# Altium footprint library Semi-ATE.PcbLib: 155 footprints (part 3 of 10)
Each footprint in its own frame and in the unit in brackets; x right, y up, seen from the top. Pads: shape width x height; smd on the part's side, far side on the other; paste and mask are expansions set on the pad; w line width, h text height; cw(c..) or ccw(c..) is an arc to the next point about the centre after c.
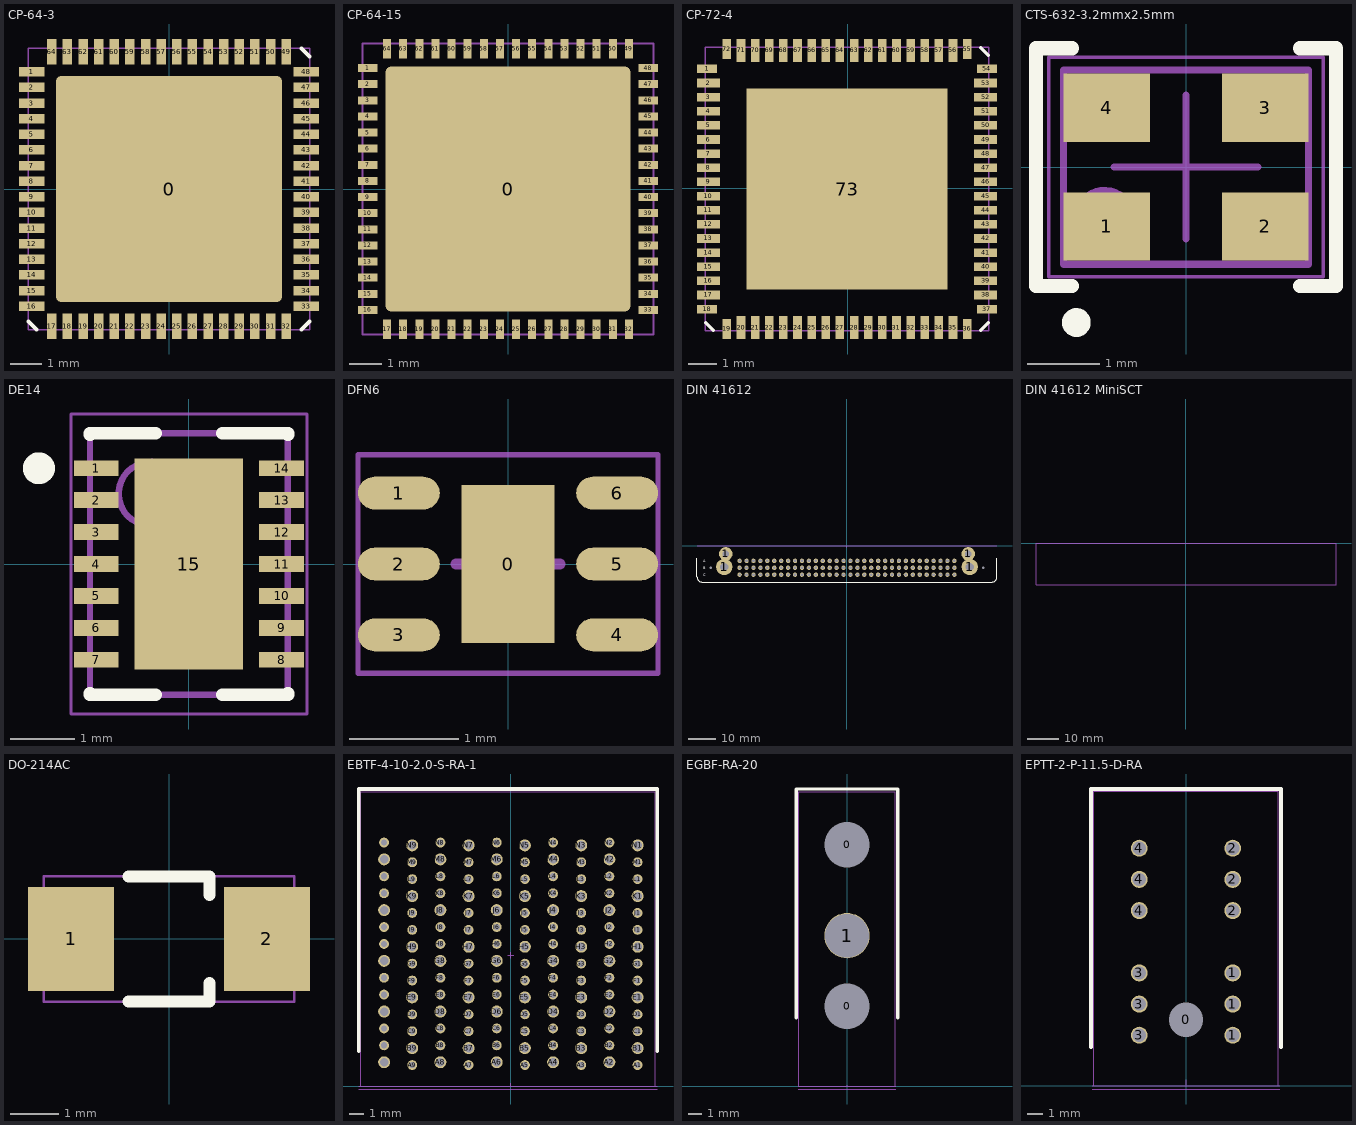
[diagram p2: the footprints below, top view; thin cyan lines are the x and y axes]

## CP-64-3 [mil] "64-Lead Lead Frame Chip Scale Package [LFCSP_VQ]"
pads (65):
  rrect5% 285x285 smd paste-314.96: 0(0,0)
  rect 32x12 smd mask+5: 1(-173,147.64) 2(-173,127.95) 3(-173,108.27) 4(-173,88.58) 5(-173,68.9) 6(-173,49.21) 7(-173,29.53) 8(-173,9.84) 9(-173,-9.84) 10(-173,-29.53) 11(-173,-49.21) 12(-173,-68.9) 13(-173,-88.58) 14(-173,-108.27) 15(-173,-127.95) 16(-173,-147.64) 33(173,-147.64) 34(173,-127.95) 35(173,-108.27) 36(173,-88.58) 37(173,-68.9) 38(173,-49.21) 39(173,-29.53) 40(173,-9.84) 41(173,9.84) 42(173,29.53) 43(173,49.21) 44(173,68.9) 45(173,88.58) 46(173,108.27) 47(173,127.95) 48(173,147.64)
  rect 12x32 smd mask+5: 17(-147.64,-173) 18(-127.95,-173) 19(-108.27,-173) 20(-88.58,-173) 21(-68.9,-173) 22(-49.21,-173) 23(-29.53,-173) 24(-9.84,-173) 25(9.84,-173) 26(29.53,-173) 27(49.21,-173) 28(68.9,-173) 29(88.58,-173) 30(108.27,-173) 31(127.95,-173) 32(147.64,-173) 49(147.64,173) 50(127.95,173) 51(108.27,173) 52(88.58,173) 53(68.9,173) 54(49.21,173) 55(29.53,173) 56(9.84,173) 57(-9.84,173) 58(-29.53,173) 59(-49.21,173) 60(-68.9,173) 61(-88.58,173) 62(-108.27,173) 63(-127.95,173) 64(-147.64,173)
Top Overlay:
  lines w5: -177,-166.74 -166.74,-177 ; 166.74,-177 177,-166.74 ; 166.74,177 177,166.74
  text "." at -181.1,173.23 h75
Top Paste:
  rectangle: 9.84,9.84 136.81,136.81
  rectangle: 9.84,-136.81 136.81,-9.84
  rectangle: -136.81,9.84 -9.84,136.81
  rectangle: -136.81,-136.81 -9.84,-9.84
Top Designator:
  text ".Designator" at -299.9,-19.99 h60
Top 3D Body:
  lines w1.97: -177.16,-177.16 177.17,-177.16 177.17,177.17 -177.16,177.17 -177.16,-177.16
3D body "CP-64-3.step": height 32.68, standoff -1.57, extent -177.16,-177.16 177.17,177.17

## CP-64-15 [mm] "64 Lead LFCSP"
height 2.5
pads (65):
  rrect5% 7.6x7.6 smd paste-8: 0(0,0)
  rect 0.6x0.25 smd: 1(-4.35,3.75) 2(-4.35,3.25) 3(-4.35,2.75) 4(-4.35,2.25) 5(-4.35,1.75) 6(-4.35,1.25) 7(-4.35,0.75) 8(-4.35,0.25) 9(-4.35,-0.25) 10(-4.35,-0.75) 11(-4.35,-1.25) 12(-4.35,-1.75) 13(-4.35,-2.25) 14(-4.35,-2.75) 15(-4.35,-3.25) 16(-4.35,-3.75) 33(4.35,-3.75) 34(4.35,-3.25) 35(4.35,-2.75) 36(4.35,-2.25) 37(4.35,-1.75) 38(4.35,-1.25) 39(4.35,-0.75) 40(4.35,-0.25) 41(4.35,0.25) 42(4.35,0.75) 43(4.35,1.25) 44(4.35,1.75) 45(4.35,2.25) 46(4.35,2.75) 47(4.35,3.25) 48(4.35,3.75)
  rect 0.25x0.6 smd: 17(-3.75,-4.35) 18(-3.25,-4.35) 19(-2.75,-4.35) 20(-2.25,-4.35) 21(-1.75,-4.35) 22(-1.25,-4.35) 23(-0.75,-4.35) 24(-0.25,-4.35) 25(0.25,-4.35) 26(0.75,-4.35) 27(1.25,-4.35) 28(1.75,-4.35) 29(2.25,-4.35) 30(2.75,-4.35) 31(3.25,-4.35) 32(3.75,-4.35) 49(3.75,4.35) 50(3.25,4.35) 51(2.75,4.35) 52(2.25,4.35) 53(1.75,4.35) 54(1.25,4.35) 55(0.75,4.35) 56(0.25,4.35) 57(-0.25,4.35) 58(-0.75,4.35) 59(-1.25,4.35) 60(-1.75,4.35) 61(-2.25,4.35) 62(-2.75,4.35) 63(-3.25,4.35) 64(-3.75,4.35)
Top Overlay:
  text "." at -4.514,4.673 h1
Top Paste:
  rectangle: -3.3,-3.3 -0.5,-0.5
  rectangle: 0.5,-3.3 3.3,-0.5
  rectangle: 0.5,0.5 3.3,3.3
  rectangle: -3.3,0.5 -0.5,3.3
Top Designator:
  text ".Designator" at -7.709,-0.42 h1.52
Top 3D Body:
  lines w0.05: -4.51,-4.51 -4.51,4.51 4.51,4.51 4.51,-4.51 -4.51,-4.51
3D body "CP-64-15.STEP": height 0.73, standoff -0.02, extent -4.51,-4.51 4.51,4.51

## CP-72-4 [mil] "72 Lead LFCSP_VQ (10x10mm)"
pads (73):
  rect 28.07x12 smd mask+5: 1(-195.97,166.32) 18(-195.97,-168.32) 37(193.97,-168.32) 54(193.97,166.32)
  rect 32x12 smd mask+5: 2(-194,146.64) 3(-194,126.95) 4(-194,107.27) 5(-194,87.58) 6(-194,67.9) 7(-194,48.21) 8(-194,28.53) 9(-194,8.84) 10(-194,-10.84) 11(-194,-30.53) 12(-194,-50.21) 13(-194,-69.9) 14(-194,-89.58) 15(-194,-109.27) 16(-194,-128.95) 17(-194,-148.64) 38(192,-148.64) 39(192,-128.95) 40(192,-109.27) 41(192,-89.58) 42(192,-69.9) 43(192,-50.21) 44(192,-30.53) 45(192,-10.84) 46(192,8.84) 47(192,28.53) 48(192,48.21) 49(192,67.9) 50(192,87.58) 51(192,107.27) 52(192,126.95) 53(192,146.64)
  rect 12x28.07 smd mask+5: 19(-168.32,-195.97) 36(166.32,-195.97) 55(166.32,193.97) 72(-168.32,193.97)
  rect 12x32 smd mask+5: 20(-148.64,-194) 21(-128.95,-194) 22(-109.27,-194) 23(-89.58,-194) 24(-69.9,-194) 25(-50.21,-194) 26(-30.53,-194) 27(-10.84,-194) 28(8.84,-194) 29(28.53,-194) 30(48.21,-194) 31(67.9,-194) 32(87.58,-194) 33(107.27,-194) 34(126.95,-194) 35(146.64,-194) 56(146.64,192) 57(126.95,192) 58(107.27,192) 59(87.58,192) 60(67.9,192) 61(48.21,192) 62(28.53,192) 63(8.84,192) 64(-10.84,192) 65(-30.53,192) 66(-50.21,192) 67(-69.9,192) 68(-89.58,192) 69(-109.27,192) 70(-128.95,192) 71(-148.64,192)
  rect 280x280 smd: 73(-1,-1)
Top Overlay:
  lines w5: -198,-187.42 -187.42,-198 ; 185.42,-198 196,-187.42 ; 185.42,196 196,185.42
  text "." at -200.79,192.91 h75
Top Designator:
  text ".Designator" at -300.9,-20.99 h60
Top 3D Body:
  lines w1.97: -198.62,-198.62 196.66,-198.62 196.66,196.66 -198.62,196.66 -198.62,-198.62
3D body "LFCSP72(CP-72-x).STEP": height 39.37, standoff 0, extent -198.62,-198.62 196.66,196.66

## CTS-632-3.2mmx2.5mm [mm]
height 1.2
pads (4):
  rect 1.2x0.95 smd: 1(-1.1,-0.825) 2(1.1,-0.825) 3(1.1,0.825) 4(-1.1,0.825)
Top Overlay:
  circle w0.2: c-1.524,-2.159 r0.1
  lines w0.2: -1.584,-1.651 -2.084,-1.651 -2.084,1.651 -1.584,1.651 ; 1.584,-1.651 2.084,-1.651 2.084,1.651 1.584,1.651
Top Designator:
  text ".Designator" at -7.618,-0.812 h1.52
Top 3D Body:
  lines w0.05: -1.905,-1.524 1.905,-1.524 1.905,1.524 -1.905,1.524 -1.905,-1.524
Bottom 3D Body:
  circle w0.1: c-1.132,-0.725 r0.4
  lines w0.1: -1.7,-1.35 1.7,-1.35 1.7,1.35 -1.7,1.35 -1.7,-1.346 ; -1.698,-1.348 -1.7,-1.346 ; -1.696,-1.35 -1.7,-1.346
Bottom Gold Plating:
  lines w0.1: -1,0 1,0 ; 0,-1 0,1
3D body: height 1.2, standoff 0, extent -1.7,-1.347 1.7,1.35

## DE14 [mm]
height 0.8
pads (15):
  rect 0.7x0.25 smd: 1(-1.45,1.5) 2(-1.45,1) 3(-1.45,0.5) 4(-1.45,0) 5(-1.45,-0.5) 6(-1.45,-1) 7(-1.45,-1.5) 8(1.45,-1.5) 9(1.45,-1) 10(1.45,-0.5) 11(1.45,0) 12(1.45,0.5) 13(1.45,1) 14(1.45,1.5)
  rect 1.7x3.3 smd: 15(0,0)
Top Overlay:
  circle w0.25: c-2.35,1.5 r0.125
  lines w0.2: -1.55,-2.025 -1.55,-2.05 -0.525,-2.05 ; -1.55,2.025 -1.55,2.05 -0.525,2.05 ; 0.525,-2.05 1.55,-2.05 1.55,-2.025 ; 0.525,2.05 1.55,2.05 1.55,2.025
Top Designator:
  text ".Designator" at -7.967,-0.508 h1.52
Top 3D Body:
  lines w0.05: -1.85,-2.35 -1.85,2.35 1.85,2.35 1.85,-2.35 -1.85,-2.35
Bottom 3D Body:
  circle w0.1: c-0.6,1.1 r0.5
  lines w0.1: -1.55,-2.05 -1.55,2.05 1.55,2.05 1.55,-2.05 -1.55,-2.05
Bottom Gold Plating:
  lines w0.1: -0.5,0 0.5,0 ; 0,-0.5 0,0.5
3D body: height 0.8, standoff 0, extent -1.55,-2.05 1.55,2.05

## DFN6 [mm] "6-DFN"
pads (7):
  rect 0.85x1.45 smd: 0(0,0)
  rrect100% 0.75x0.3 smd: 1(-1,0.65) 2(-1,0) 3(-1,-0.65) 4(1,-0.65) 5(1,0) 6(1,0.65)
Top Designator:
  text ".Designator" at -7.618,-0.508 h1.52
Top 3D Body:
  lines w0.05: -1.375,-1 1.375,-1 1.375,1 -1.375,1 -1.375,-1
Bottom Gold Plating:
  lines w0.1: -0.475,0 0.475,0 ; 0,-0.475 0,0.475
3D body "DFN6.STEP": height 0.75, standoff 0, extent -1.001,-1 1.001,1

## DIN41612 Spacer MiniSCT LB [mm]
Top Designator:
  text ".Designator" at -7.617,-0.508 h1.52
3D body "Din41612_Spacer_MiniSCT_LB.STEP": height 10, standoff 0, extent -47.5,-4.375 47.5,4.375

## DIN 41612 [mm]
pads (102):
  round 0.5 hole 1 unplated paste+0.1 mask-1: 0(-50,-8.03) 0(50,-8.03)
  round 6 hole 3 paste-3 mask+0.1: 1(-45,-7.73) 1(45,-7.73)
  round 5 hole 2.5 paste-3 mask+0.1: 1(-44.45,-2.95) 1(44.45,-2.95)
  round 1.6 hole 1: A1(-39.37,-5.49) A2(-36.83,-5.49) A3(-34.29,-5.49) A4(-31.75,-5.49) A5(-29.21,-5.49) A6(-26.67,-5.49) A7(-24.13,-5.49) A8(-21.59,-5.49) A9(-19.05,-5.49) A10(-16.51,-5.49) A11(-13.97,-5.49) A12(-11.43,-5.49) A13(-8.89,-5.49) A14(-6.35,-5.49) A15(-3.81,-5.49) A16(-1.27,-5.49) A17(1.27,-5.49) A18(3.81,-5.49) A19(6.35,-5.49) A20(8.89,-5.49) A21(11.43,-5.49) A22(13.97,-5.49) A23(16.51,-5.49) A24(19.05,-5.49) A25(21.59,-5.49) A26(24.13,-5.49) A27(26.67,-5.49) A28(29.21,-5.49) A29(31.75,-5.49) A30(34.29,-5.49) A31(36.83,-5.49) A32(39.37,-5.49) B1(-39.37,-8.03) B2(-36.83,-8.03) B3(-34.29,-8.03) B4(-31.75,-8.03) B5(-29.21,-8.03) B6(-26.67,-8.03) B7(-24.13,-8.03) B8(-21.59,-8.03) B9(-19.05,-8.03) B10(-16.51,-8.03) B11(-13.97,-8.03) B12(-11.43,-8.03) B13(-8.89,-8.03) B14(-6.35,-8.03) B15(-3.81,-8.03) B16(-1.27,-8.03) B17(1.27,-8.03) B18(3.81,-8.03) B19(6.35,-8.03) B20(8.89,-8.03) B21(11.43,-8.03) B22(13.97,-8.03) B23(16.51,-8.03) B24(19.05,-8.03) B25(21.59,-8.03) B26(24.13,-8.03) B27(26.67,-8.03) B28(29.21,-8.03) B29(31.75,-8.03) B30(34.29,-8.03) B31(36.83,-8.03) B32(39.37,-8.03) C1(-39.37,-10.57) C2(-36.83,-10.57) C3(-34.29,-10.57) C4(-31.75,-10.57) C5(-29.21,-10.57) C6(-26.67,-10.57) C7(-24.13,-10.57) C8(-21.59,-10.57) C9(-19.05,-10.57) C10(-16.51,-10.57) C11(-13.97,-10.57) C12(-11.43,-10.57) C13(-8.89,-10.57) C14(-6.35,-10.57) C15(-3.81,-10.57) C16(-1.27,-10.57) C17(1.27,-10.57) C18(3.81,-10.57) C19(6.35,-10.57) C20(8.89,-10.57) C21(11.43,-10.57) C22(13.97,-10.57) C23(16.51,-10.57) C24(19.05,-10.57) C25(21.59,-10.57) C26(24.13,-10.57) C27(26.67,-10.57) C28(29.21,-10.57) C29(31.75,-10.57) C30(34.29,-10.57) C31(36.83,-10.57) C32(39.37,-10.57)
Top Overlay:
  lines w0.254: -55,-4.5 -55,-11.3 ccw(c-53,-11.3) -53,-13.3 ; -53.02,-13.3 53,-13.3 ccw(c53,-11.3) 55,-11.3 55,-4.5
  text "A" at -52.718,-6.023 h1
  text "C" at -52.733,-11.068 h1
  text "B" at -52.713,-8.549 h1
  text "." at -39.6,-3.96 h1
Top Designator:
  text ".Designator" at -7.618,-7.218 h1.52
Bottom Gold Plating:
  lines w0.012: -54.9,0 54.9,0 ; 0,-0.5 0,0

## DIN 41612 LB StandOff [mm] "DIN 41612 LB StandOff"
Top Designator:
  text ".Designator" at -7.63,-0.521 h1.52

## DIN 41612 MaxiSCT [mm] "09732966801"
Top Designator:
  text ".Designator" at -7.618,-2.418 h1.52
3D body "DIN41612 MaxiSCT.STEP": height 9.1, standoff -3.6, extent -47,-10.97 47,7.15

## DIN 41612 MiniSCT [mm] "09032962861"
Top Designator:
  text ".Designator" at -7.467,-7.173 h1.52
Top 3D Body:
  lines w0.05: -47.572,-13.33 47.874,-13.33 47.874,0 -47.572,0 -47.572,-13.33
3D body "DIN41612 MiniSCT.STEP": height 19.6, standoff -5.4, extent -47.572,-13.33 47.874,-2.73

## DIN 41612 MiniSCT Spacer [mm] "09032962861"
Top Designator:
  text ".Designator" at -7.618,-8.538 h1.52
3D body "DIN41612 MiniSCT Spacer.STEP": height 7.7, standoff -0.97, extent -55,-13.33 55,-2.73

## DO-214AC [mil] "DO-214AC entspricht SMA"
height 98.43
pads (2):
  rect 70x85 smd: 1(-80,0) 2(80,0)
Top Overlay:
  lines w10: -33,-51.01 33,-51.01 33,-36.01 ; -33,51 33,51 33,36
Top Designator:
  text ".Designator" at -299.9,-20 h60
Top 3D Body:
  lines w1.97: -102.36,-51.19 102.37,-51.19 102.37,51.17 -102.36,51.17 -102.36,-51.19
3D body "DO-214AC.STEP": height 94.59, standoff 0, extent -102.36,-51.18 102.37,51.18

## EBTF-4-10-2.0-S-RA-1 [mm] "Signals MaxiSCT (SCT8 side)"
pads (140):
  round 0.7 hole 0.45: A1(9,1.5) A3(5,1.5) A5(1,1.5) A7(-3,1.5) A9(-7,1.5) B2(7,2.9) B4(3,2.9) B6(-1,2.9) B8(-5,2.9) B10(-9,2.9) C1(9,3.9) C2(7,4.1) C3(5,3.9) C4(3,4.1) C5(1,3.9) C6(-1,4.1) C7(-3,3.9) C8(-5,4.1) C9(-7,3.9) C10(-9,4.1) D1(9,5.1) D3(5,5.1) D5(1,5.1) D7(-3,5.1) D9(-7,5.1) E2(7,6.5) E4(3,6.5) E6(-1,6.5) E8(-5,6.5) E10(-9,6.5) F1(9,7.5) F2(7,7.7) F3(5,7.5) F4(3,7.7) F5(1,7.5) F6(-1,7.7) F7(-3,7.5) F8(-5,7.7) F9(-7,7.5) F10(-9,7.7) G1(9,8.7) G3(5,8.7) G5(1,8.7) G7(-3,8.7) G9(-7,8.7) H2(7,10.1) H4(3,10.1) H6(-1,10.1) H8(-5,10.1) H10(-9,10.1) I1(9,11.1) I2(7,11.3) I3(5,11.1) I4(3,11.3) I5(1,11.1) I6(-1,11.3) I7(-3,11.1) I8(-5,11.3) I9(-7,11.1) I10(-9,11.3) J1(9,12.3) J3(5,12.3) J5(1,12.3) J7(-3,12.3) J9(-7,12.3) K2(7,13.7) K4(3,13.7) K6(-1,13.7) K8(-5,13.7) K10(-9,13.7) L1(9,14.7) L2(7,14.9) L3(5,14.7) L4(3,14.9) L5(1,14.7) L6(-1,14.9) L7(-3,14.7) L8(-5,14.9) L9(-7,14.7) L10(-9,14.9) M1(9,15.9) M3(5,15.9) M5(1,15.9) M7(-3,15.9) M9(-7,15.9) N2(7,17.3) N4(3,17.3) N6(-1,17.3) N8(-5,17.3) N10(-9,17.3)
  round 0.85 hole 0.6: A2(7,1.7) A4(3,1.7) A6(-1,1.7) A8(-5,1.7) A10(-9,1.7) B1(9,2.7) B3(5,2.7) B5(1,2.7) B7(-3,2.7) B9(-7,2.7) D2(7,5.3) D4(3,5.3) D6(-1,5.3) D8(-5,5.3) D10(-9,5.3) E1(9,6.3) E3(5,6.3) E5(1,6.3) E7(-3,6.3) E9(-7,6.3) G2(7,8.9) G4(3,8.9) G6(-1,8.9) G8(-5,8.9) G10(-9,8.9) H1(9,9.9) H3(5,9.9) H5(1,9.9) H7(-3,9.9) H9(-7,9.9) J2(7,12.5) J4(3,12.5) J6(-1,12.5) J8(-5,12.5) J10(-9,12.5) K1(9,13.5) K3(5,13.5) K5(1,13.5) K7(-3,13.5) K9(-7,13.5) M2(7,16.1) M4(3,16.1) M6(-1,16.1) M8(-5,16.1) M10(-9,16.1) N1(9,17.1) N3(5,17.1) N5(1,17.1) N7(-3,17.1) N9(-7,17.1)
Top Overlay:
  lines w0.254: -10.8,2.498 -10.8,21.1 10.4,21.1 10.4,2.5
Top Designator:
  text ".Designator" at -7.818,6.356 h1.52
Top 3D Body:
  lines w0.05: -10.668,0 0,0 10.25,0 10.25,20.9 -10.668,20.9 -10.668,3.175 -10.668,0
Bottom Gold Plating:
  lines w0.012: -10.8,0 10.4,0 ; 0,0 0,0.2
  lines w0.013: -10.8,-0.2 10.4,-0.2 ; -0.2,9.3 0.2,9.3 ; 0,9.1 0,9.5
3D body "EBTF-4-10-2.0-S-RA-1.STEP": height 17.9, standoff -4.6, extent -10.65,-7.5 10.25,20.9

## EGBF-RA-20 [mm] "Alignment with Backplane (Card Side)"
pads (3):
  round 1 hole 3.3 unplated: 0(0,5.82) 0(0,17.57)
  round 3.3 / inner round 0 / far side round 5.5 hole 3.175 paste-3: 1(0,10.95)
Top Overlay:
  lines w0.254: -3.7,5 -3.7,21.62 3.7,21.62 3.7,5
Top Designator:
  text ".Designator" at -7.618,5.176 h1.52
Top 3D Body:
  lines w0.05: -3.525,0 -3.525,21.42 3.525,21.42 3.525,0 0,0 -3.525,0
Bottom Gold Plating:
  lines w0.012: -3.54,-0.2 3.54,-0.2 ; -3.54,0 3.54,0 ; 0,0 0,0.08
3D body "EGBF-RA-20.STEP": height 14.7, standoff -4, extent -3.525,-10.379 3.525,21.42

## EPTT-2-P-11.5-D-RA [mm] "Power MaxiSCT (Card Side)"
pads (13):
  round 1.09 hole 2.2 unplated: 0(0,4.25)
  round 1.09 hole 0.84: 1(3,3.25) 1(3,5.25) 1(3,7.25) 2(3,11.25) 2(3,13.25) 2(3,15.25) 3(-3,3.25) 3(-3,5.25) 3(-3,7.25) 4(-3,11.25) 4(-3,13.25) 4(-3,15.25)
Top Overlay:
  lines w0.254: -6.1,2.5 -6.1,19.05 6.1,19.05 6.1,2.505
Top Designator:
  text ".Designator" at -7.618,3.031 h1.52
Top 3D Body:
  lines w0.05: -5.925,0 0,0 5.925,0 5.925,18.9 -5.925,18.9 -5.925,0
Bottom Gold Plating:
  lines w0.012: -6,-0.2 6,-0.2 ; -6,0 6,0 ; 0,0 0,0.4
3D body "EPTT-2-P-11.5-D-RA.STEP": height 11.5, standoff -4.4, extent -5.925,-12.1 5.925,18.9